# Altium footprint library Apalis Evaluation Board.PcbLib: 212 footprints (part 6 of 14)
Each footprint in its own frame and in the unit in brackets; x right, y up, seen from the top. Pads: shape width x height; smd on the part's side, far side on the other; paste and mask are expansions set on the pad; w line width, h text height; cw(c..) or ccw(c..) is an arc to the next point about the centre after c.
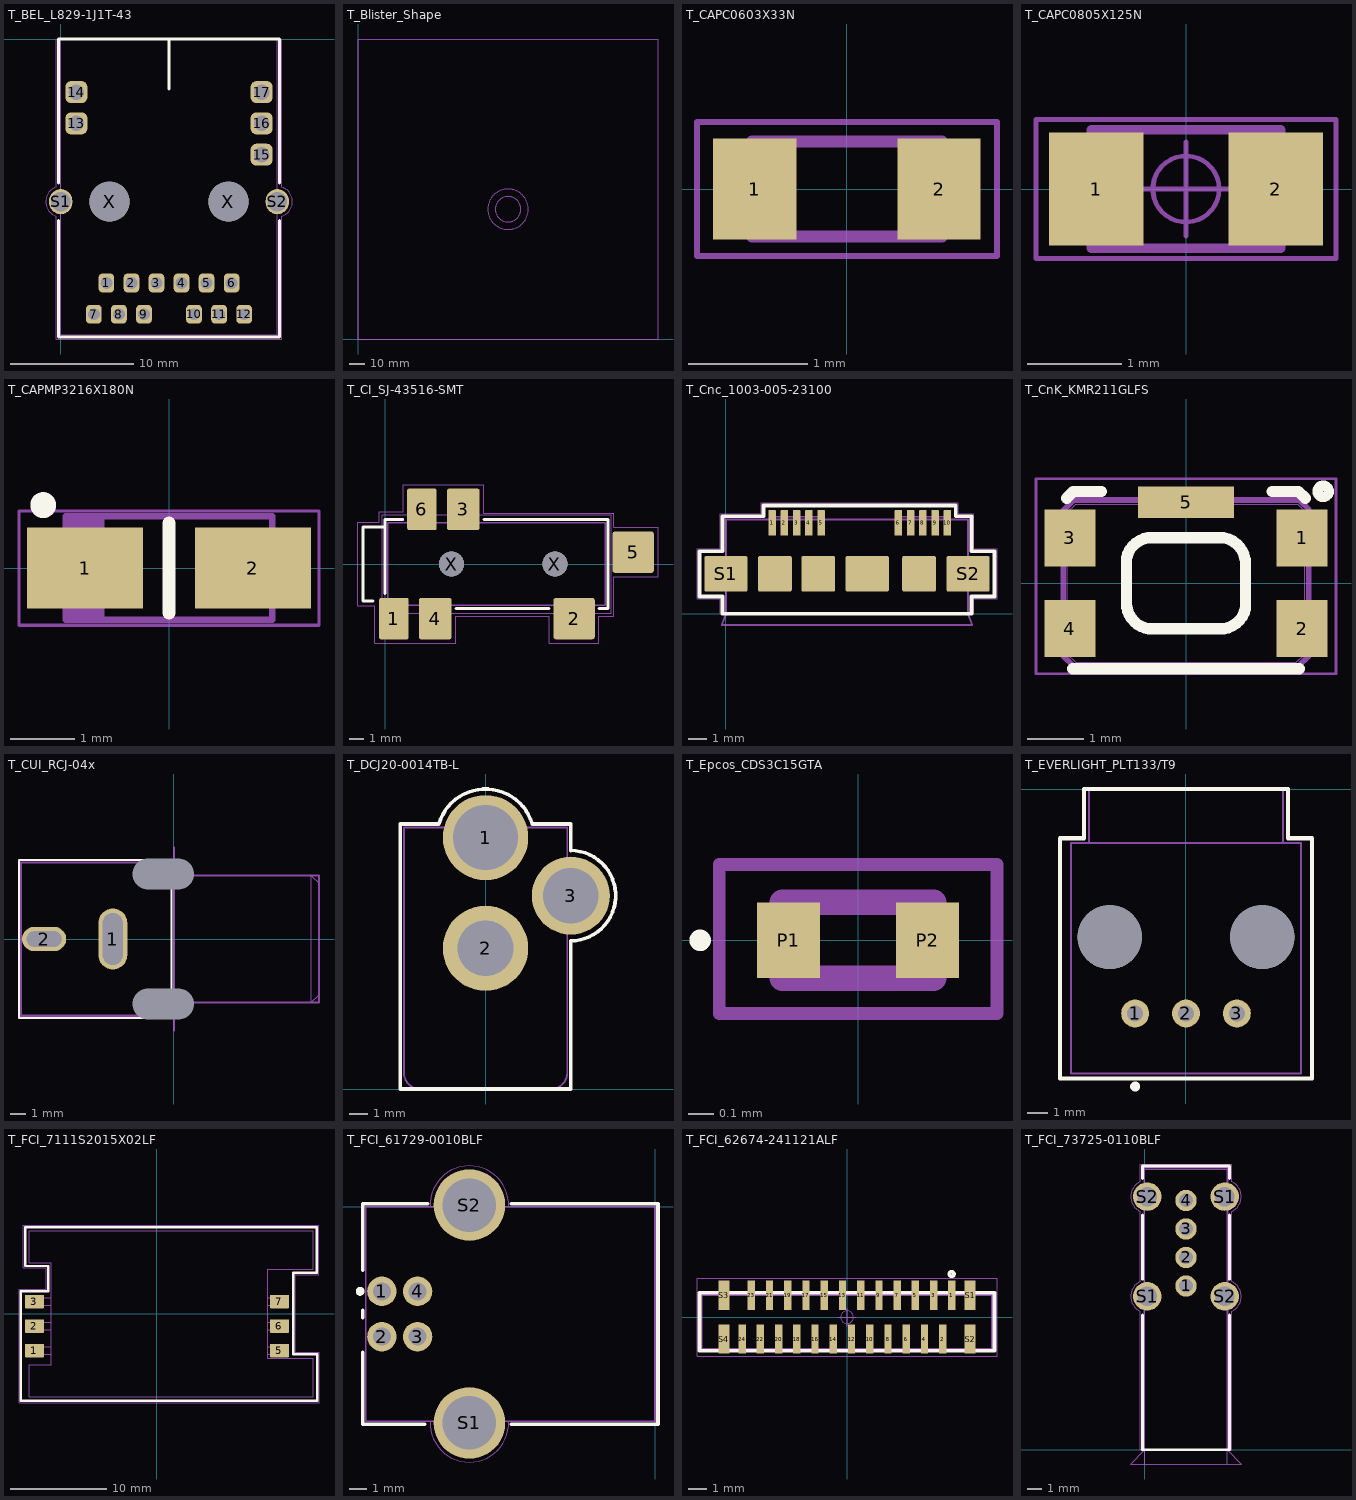
[diagram p5: the footprints below, top view; thin cyan lines are the x and y axes]

## T_BEL_L829-1J1T-43 [mil] "LOW PROFILE GIGABIT ETHERNET JACK WITH MAGS"
height 445
pads (21):
  rrect50% 50x60 hole 38: 1(146,-779.68) 2(226,-779.68) 3(306,-779.68) 4(386,-779.68) 5(466,-779.68) 6(546,-779.68) 7(106,-879.68) 8(186,-879.68) 9(266,-879.68) 10(426,-879.68) 11(506,-879.68) 12(586,-879.68)
  rrect50% 70x70 hole 50: 13(50,-269.69) 14(50,-169.69) 15(642,-369.69) 16(642,-269.69) 17(642,-169.69)
  oval 74x80 hole 62: S1(0,-519.68) S2(692,-519.68)
  round 128 hole 128 unplated: X(156,-519.68) X(536,-519.68)
Top Overlay:
  lines w10: -6.95,-579.68 -6.95,-951.77 699.02,-951.77 699.02,-579.68 ; -6.95,-459.49 -6.95,0 699.02,0 699.02,-460 ; 346,-159.69 346,-0.06 346.06,0
Mechanical 1:
  lines w1.97: -13.78,-473.23 -13.78,0 705.91,0 705.91,-473.24 ; -13.76,-473.28 ccw(c0.2,-519.71) -13.78,-566.13 -13.78,-958.66 705.91,-958.66 705.91,-566.09 ; 705.89,-566.05 ccw(c691.8,-519.66) 705.89,-473.28
Mechanical 2:
  lines w0.04: 0,-944.88 0,0 692.13,0 692.13,-944.88 0,-944.88
Mechanical 3:
  lines w3.94: 0,-944.88 0,0 692.13,0 692.13,-944.88 0,-944.88
3D body "l829-1j1t-43.step": height 494.05, standoff -150.89, extent -54.94,-946.68 746.36,19.67

## T_Blister_Shape [mm]
Mechanical 2:
  circle w0.254: c100,86.5 r8.5
  circle w0.254: c100,86.5 r13.5
Mechanical 15:
  lines w0.01: 0,0 200,0 200,200 0,200 0,0
3D body: height 24.9, standoff 22.4, extent 87.549,74.025 112.451,98.975
3D body: height 22.1, standoff 19.6, extent 88.047,74.524 111.953,98.476
3D body: height 19.3, standoff 16.8, extent 88.545,75.023 111.455,97.977
3D body: height 16.5, standoff 14, extent 89.043,75.522 110.957,97.478
3D body: height 13.7, standoff 11.2, extent 89.541,76.021 110.459,96.979
3D body: height 10.9, standoff 8.4, extent 90.039,76.52 109.961,96.48
3D body: height 27.7, standoff 25.2, extent 86.553,73.027 113.447,99.973
3D body: height 8.1, standoff 5.6, extent 90.537,77.019 109.463,95.981
3D body: height 5.3, standoff 2.8, extent 91.035,77.518 108.965,95.482
3D body: height 2.8, standoff 0, extent 91.534,78.017 108.466,94.983

## T_CAPC0603X33N [mm]
height 0.8
pads (2):
  rect 0.7x0.85 smd: 1(-0.775,0) 2(0.775,0)
Mechanical 1:
  lines w0.05: -1.261,-0.563 1.262,-0.563 1.262,0.563 -1.261,0.563 -1.261,-0.563
Mechanical 2:
  lines w0.001: -0.8,-0.4 0.8,-0.4 0.8,0.4 -0.8,0.4 -0.8,-0.4
Mechanical 3:
  lines w0.1: -0.8,-0.4 0.8,-0.4 0.8,0.4 -0.8,0.4 -0.8,-0.4
3D body: height 0.9, standoff 0, extent -0.8,-0.4 0.8,0.4

## T_CAPC0805X125N [mm]
height 1.25
pads (2):
  rect 1x1.2 smd: 1(-0.95,0) 2(0.95,0)
Mechanical 1:
  circle w0.05: c0,0 r0.35
  lines w0.05: -0.5,0 0.5,0 ; 0,-0.5 0,0.5 ; -1.586,-0.736 1.586,-0.736 1.586,0.736 -1.586,0.736 -1.586,-0.736
Mechanical 2:
  lines w0.001: -1,-0.625 -1,0.625 1,0.625 1,-0.625 -1,-0.625
Mechanical 3:
  lines w0.1: -1,-0.625 1,-0.625 1,0.625 -1,0.625 -1,-0.625
3D body: height 1.4, standoff 0, extent -1,-0.625 1,0.625

## T_CAPMP3216X180N [mm]
height 1.6
pads (2):
  rect 1.8x1.25 smd: 1(-1.3,0) 2(1.3,0)
Top Overlay:
  circle w0.3: c-1.95,0.975 r0.05
  lines w0.2: 0,-0.699 0,0.699
Mechanical 1:
  lines w0.05: -2.325,-0.886 2.325,-0.886 2.325,0.886 -2.325,0.886 -2.325,-0.886
Mechanical 2:
  lines w0.001: -1.6,-0.8 -1.6,0.8 1.6,0.8 1.6,-0.8 -1.6,-0.8
Mechanical 3:
  lines w0.1: -1.55,-0.8 -1.55,0.8 ; -1.45,-0.8 -1.45,0.8 ; -1.35,-0.8 -1.35,0.8 ; -1.25,-0.8 -1.25,0.8 ; -1.15,-0.8 -1.15,0.8 ; -1.05,-0.8 -1.05,0.8 ; -1.6,-0.8 -1.6,0.8 1.6,0.8 1.6,-0.8 -1.6,-0.8
3D body: height 1.6, standoff 0, extent -1.6,-0.8 -1,0.8
3D body: height 1.6, standoff 0, extent -1,-0.8 1.6,0.8

## T_CI_SJ-43516-SMT [mm] "STEREO_3.5mm AUDIO JACK  CUI"
height 5
pads (8):
  rrect12% 2x2.8 smd: 1(0.6,-3.7) 6(2.5,3.7)
  rrect12% 2.8x2.8 smd: 2(12.8,-3.7) 5(16.8,0.8)
  rrect12% 2.2x2.8 smd: 3(5.3,3.7) 4(3.4,-3.7)
  round 1.7 hole 1.7 unplated: X(4.5,0) X(11.5,0)
Top Overlay:
  lines w0.2: -0.8,-2.5 -1.5,-2.5 -1.5,2.5 0,2.5 ; 0,-2 0,3 1.2,3 ; 4.8,-3 11.1,-3 ; 6.7,3 15.1,3 15.1,-3 14.5,-3
Mechanical 1:
  lines w0.05: -1.83,-2.83 -0.68,-2.83 -0.68,-5.38 4.78,-5.38 4.78,-3.53 11.12,-3.53 11.12,-5.38 14.48,-5.38 14.48,-3.53 15.48,-3.53 15.48,-0.87 18.48,-0.87 18.48,2.48 15.48,2.48 15.48,3.45 6.68,3.45 6.68,5.38 1.22,5.38 1.22,3.53 -0.39,3.53 -0.39,2.83 -1.83,2.83 -1.83,-2.83
Mechanical 2:
  lines w0.001: -0.2,-3.35 15.3,-3.35 15.3,3.35 -0.2,3.35 -0.2,-3.35
Mechanical 3:
  lines w0.1: 0.2,-2.8 0.2,2.8 14.9,2.8 14.9,-2.8 0.2,-2.8

## T_Cnc_1003-005-23100 [mm] "USB Micro A/B 3.0"
height 2.92
pads (16):
  rrect12% 0.4x1.35 smd: 1(2.45,4.825) 2(3.1,4.825) 3(3.75,4.825) 4(4.4,4.825) 5(5.05,4.825) 6(9.15,4.825) 7(9.8,4.825) 8(10.45,4.825) 9(11.1,4.825) 10(11.75,4.825)
  rrect12% 2.3x1.9 smd: S1(0,2.125) S2(12.85,2.125) ""(7.5,2.125)
  rrect12% 1.8x1.9 smd: ""(2.6,2.125) ""(4.9,2.125) ""(10.25,2.125)
Top Overlay:
  lines w0.2: -1.4,0.925 -0.175,0.925 -0.175,0 13.025,0 13.025,0.925 14.25,0.925 14.25,3.325 13.025,3.325 13.025,5.175 12.2,5.175 12.2,5.755 2,5.755 2,5.175 -0.175,5.175 -0.175,3.325 -1.4,3.325 -1.4,0.925
Mechanical 1:
  lines w0.05: -1.535,0.79 -0.31,0.79 -0.31,0 13.16,0 13.16,0.79 14.385,0.79 14.385,3.46 13.16,3.46 13.16,5.31 12.335,5.31 12.335,5.89 1.865,5.89 1.865,5.31 -0.31,5.31 -0.31,3.46 -1.535,3.46 -1.535,0.79
Mechanical 2:
  lines w0.001: 0,1.675 -0.64,1.675 -0.64,2.575 0,2.575 ; 2.35,5 2.35,5.15 5.15,5.15 5.15,5 ; 9.05,5 9.05,5.15 11.85,5.15 11.85,5 ; 12.85,1.675 13.49,1.675 13.49,2.575 12.85,2.575 ; 0,0 12.85,0 ; 0,0 -0.22,-0.6 13.07,-0.6 12.85,0 ; 0,0 0,5 12.85,5 12.85,0
Mechanical 3:
  lines w0.1: 0,1.675 -0.64,1.675 -0.64,2.575 0,2.575 ; 2.35,5 2.35,5.15 5.15,5.15 5.15,5 ; 9.05,5 9.05,5.15 11.85,5.15 11.85,5 ; 12.85,1.675 13.49,1.675 13.49,2.575 12.85,2.575 ; 0,0 12.85,0 ; 0,0 0,5 12.85,5 12.85,0 ; 0,0 -0.22,-0.6 13.07,-0.6 12.85,0
3D body "USB3125.STEP": height 2.78, standoff -0.24, extent -0.65,-0.624 13.5,5.05

## T_CnK_KMR211GLFS [mm] "Microminiature Tact Switch for SMT"
height 1.9
pads (5):
  rect 0.9x1 smd: 1(2.05,0.8) 2(2.05,-0.8) 3(-2.05,0.8) 4(-2.05,-0.8)
  rect 1.7x0.55 smd: 5(0,1.43)
Top Overlay:
  circle w0.18: c2.424,1.624 r0.1
  lines w0.2: -2.109,1.502 -1.991,1.62 -1.5,1.62 ; -2,-1.51 2,-1.51 ; -1.05,-0.36 -1.05,0.44 ; -1.05,-0.35 ccw(c-0.59,-0.35) -0.662,-0.804 ; -1.05,0.444 cw(c-0.6,0.35) -0.669,0.805 ; -0.66,0.805 0.66,0.805 ; -0.655,-0.805 0.65,-0.805 ; 0.669,-0.805 ccw(c0.6,-0.35) 1.05,-0.444 ; 0.684,0.8 cw(c0.59,0.35) 1.045,0.419 ; 1.05,-0.44 1.05,0.4 ; 1.52,1.621 1.989,1.621 2.108,1.502
Mechanical 1:
  lines w0.05: -2.65,-1.6 -2.65,1.845 2.65,1.845 2.65,-1.6 -2.65,-1.6
Mechanical 2:
  lines w0.001: -2.1,-1.25 -2.1,1.25 -1.95,1.4 1.97,1.4 2.1,1.27 2.1,-1.25 1.95,-1.4 -1.95,-1.4 -2.1,-1.25
Mechanical 3:
  lines w0.1: -2.17,-1.28 -2.17,1.28 -1.98,1.47 2,1.47 2.17,1.3 2.17,-1.28 1.98,-1.47 -1.98,-1.47 -2.17,-1.28

## T_CUI_RCJ-04x [mm] "Right Angle RCA Connector THT"
height 12.6
pads (4):
  oval 1.9x4 hole 1.3 slot 3.4 at 90 deg: 1(-4,0)
  oval 2.9x1.6 hole 1 slot 2.3 at 0 deg: 2(-8.5,0)
  round 0 hole 2 slot 4 at 0 deg: Hole1(-0.7,4.25) Hole2(-0.7,-4.25)
Top Overlay:
  lines w0.127: -0.147,5.165 -10.143,5.165 -10.143,-5.165 -0.146,-5.165 -0.146,5.144
Mechanical 1:
  lines w0.127: -10.123,-5.152 -10.123,5.185 0,5.185 0,-5.152 -10.123,-5.152
Mechanical 2:
  lines w0: 0,-5 0,5
  lines w0.001: 0,-5 -10,-5 -10,5 0,5 ; 0,-4.15 9,-4.15 ; 0,4.15 9,4.15 ; 9,-4.15 9,4.15 ; 9,-4.15 9.5,-3.65 9.5,3.65 9,4.15
Mechanical 3:
  lines w0.127: 0,-6 0,6 ; 0,-4.15 9.5,-4.15 9.5,4.15 0,4.15 ; -10,-5 -10,5 0,5 0,-5 -10,-5

## T_DCJ20-0014TB-L [mm] "Header, 1x2 Pins, 2.54 mm pitch, male"
height 10.7
pads (3):
  round 4.7 hole 3.58: 1(0,13.85)
  round 4.7 hole 3.07: 2(0,7.75)
  round 4.3 hole 3.07: 3(4.7,10.65)
Top Overlay:
  lines w0.2: -2.569,14.598 cw(c0,13.85) 2.569,14.6 4.7,14.6 4.7,13.142 cw(c4.675,10.65) 4.7,8.158 ; -2.569,14.6 -4.7,14.6 -4.7,0 4.675,0 ; 4.7,0 4.7,8.157
Mechanical 1:
  lines w0.05: 4.675,0 -4.7,0 -4.7,14.6 -2.568,14.6 cw(c0,13.85) 2.568,14.6 4.7,14.6 4.7,13.125 cw(c4.7,10.65) 4.7,8.175 4.7,0
Mechanical 2:
  lines w0.001: -1.4,13.95 -1.4,14.4 -4.5,14.4 -4.5,0.9 ccw(c-3.6,0.9) -3.6,0 3.6,0 ; 1.4,13.95 1.4,14.4 4.5,14.4 4.5,0.9 cw(c3.6,0.9) 3.6,0
Mechanical 3:
  lines w0.1: -4.5,0.9 ccw(c-3.6,0.9) -3.6,0 3.6,0 ccw(c3.6,0.9) 4.5,0.9 4.5,14.4 -4.5,14.4 -4.5,0.9
3D body: height 7.4, standoff 5.4, extent -1,0 0.992,2
3D body: height 9.59, standoff 3.21, extent -3.2,0 3.175,2
3D body: height 4, standoff -3.7, extent -1.4,13.75 1.4,13.95
3D body: height 4, standoff -3.7, extent -1.2,7.65 1.2,7.85
3D body: height 4, standoff -3.7, extent 4.5,9.45 4.7,11.85
3D body: height 10.7, standoff 0, extent -4.5,0 4.5,14.4

## T_Epcos_CDS3C15GTA [mm] "Bidirectional ESD Protection"
height 0.27
pads (2):
  rect 0.25x0.3 smd: P1(-0.275,0) P2(0.275,0)
Top Overlay:
  circle w0.06: c-0.625,0 r0.012
Mechanical 1:
  lines w0.05: -0.55,-0.29 0.55,-0.29 0.55,0.3 -0.55,0.3 -0.55,-0.29
Mechanical 2:
  lines w0.001: -0.315,-0.165 0.315,-0.165 0.315,0.165 -0.315,0.165 -0.315,-0.165
Mechanical 3:
  lines w0.1: -0.3,-0.15 0.3,-0.15 0.3,0.15 -0.3,0.15 -0.3,-0.15
3D body: height 0.27, standoff 0, extent -0.315,-0.165 0.315,0.165

## T_EVERLIGHT_PLT133/T9 [mm] "USB Type B Connectors"
height 20
pads (5):
  round 1.4 hole 0.8: 1(-2.54,-11.21) 2(0,-11.21) 3(2.54,-11.21)
  round 3.2 hole 3.2 unplated: ""(-3.81,-7.4) ""(3.81,-7.4)
Top Overlay:
  circle w0.25: c-2.54,-14.86 r0.125
  lines w0.2: -6.3,-14.46 6.3,-14.46 6.3,-2.46 5.1,-2.46 5.1,0 -5.1,0 -5.1,-2.46 -6.3,-2.46 -6.3,-14.46
Mechanical 1:
  lines w0.05: -6.3,-14.46 -6.3,-2.46 -5.1,-2.46 -5.1,0 5.1,0 5.1,-2.46 6.3,-2.46 6.3,-14.46 -6.3,-14.46
Mechanical 2:
  lines w0.01: -4.85,-2.7 -4.85,0 4.85,0 4.85,-2.7 ; -5.75,-14.21 5.75,-14.21 5.75,-2.7 -5.75,-2.7 -5.75,-14.21
Mechanical 3:
  lines w0.1: -4.85,-2.7 -4.85,0 4.85,0 4.85,-2.7 ; -5.75,-14.21 5.75,-14.21 5.75,-2.7 -5.75,-2.7 -5.75,-14.21
3D body "User Library-PLT133_T9.step": height 19.12, standoff -4.15, extent -5.75,-13.715 5.75,0.085

## T_FCI_7111S2015X02LF [mm] "6 Contacts Sim Card Holder"
height 2.5
pads (6):
  rrect12% 2x1.4 smd: 1(-12.7,-3.81) 2(-12.7,-1.27) 3(-12.7,1.27) 5(12.7,-3.81) 6(12.7,-1.27) 7(12.7,1.27)
Top Overlay:
  lines w0.254: -14.1,-9 -14.1,2.35 -11.25,2.35 -11.25,4.95 -13.65,4.95 -13.65,8.95 16.55,8.95 16.55,4.25 14.15,4.25 14.15,-4.2 16.6,-4.2 16.6,-9 -14.1,-9
Mechanical 1:
  lines w0.05: -14.3,-9.2 16.8,-9.2 16.8,-4 14.35,-4 14.35,4.05 16.75,4.05 16.75,9.15 -13.85,9.15 -13.85,4.75 -11.45,4.75 -11.45,2.55 -14.3,2.55 -14.3,-9.2
Mechanical 2:
  lines w0.01: -10.95,-4.21 -13.25,-4.21 -13.25,-3.41 -10.95,-3.41 ; -10.95,-1.67 -13.25,-1.67 -13.25,-0.87 -10.95,-0.87 ; -10.95,0.87 -13.25,0.87 -13.25,1.67 -10.95,1.67 ; 11.49,-4.21 13.25,-4.21 13.25,-3.41 11.49,-3.41 ; 11.49,-1.67 13.25,-1.67 13.25,-0.87 11.49,-0.87 ; 11.49,0.87 13.25,0.87 13.25,1.67 11.49,1.67 ; -13.25,-8.6 -13.25,-5.3 -10.95,-5.3 -10.95,5.3 -13.25,5.3 -13.25,8.6 16.19,8.6 16.19,4.6 11.49,4.6 11.49,-4.6 16.19,-4.6 16.19,-8.6 -13.25,-8.6
Mechanical 3:
  lines w0.1: -13.25,-8.6 16.19,-8.6 16.19,-4.6 11.49,-4.6 11.49,4.6 16.19,4.6 16.19,8.6 -13.25,8.6 -13.25,5.3 -10.95,5.3 -10.95,-5.3 -13.25,-5.3 -13.25,-8.6
3D body "SW3dPS-SIMLOCK-1.STEP": height 2.5, standoff 0, extent -13.552,-8.726 16.448,8.574

## T_FCI_61729-0010BLF [mm] "USB Type B Connectors"
height 10.6
pads (6):
  round 1.65 hole 1: 1(-15.3,-4.73) 2(-15.3,-7.27) 3(-13.3,-7.27) 4(-13.3,-4.73)
  round 4 hole 3: S1(-10.4,-12.1) S2(-10.4,0.1)
Top Overlay:
  circle w0.25: c-16.512,-4.73 r0.125
  lines w0.2: -16.362,-8.14 -16.362,-12.163 -12.89,-12.163 ; -16.362,-6.21 -16.362,-5.8 ; -16.362,-3.55 -16.362,0.162 -12.737,0.162 ; -8.062,-12.163 0.163,-12.163 0.163,0.162 -8.062,0.162
Mechanical 1:
  lines w0.05: -16.2,-12 -12.598,-12 ccw(c-10.4,-12.096) -8.202,-12 0,-12 0,-0.003 -0.003,0 -8.202,0 ccw(c-10.4,0.096) -12.598,0 -16.2,0 -16.2,-12
Mechanical 2:
  lines w0.001: -16.2,-12 0,-12 0,0 -16.2,0 -16.2,-12
Mechanical 3:
  lines w0.1: -16.2,-12 0,-12 0,0 -16.2,0 -16.2,-12
3D body "Samtec-USBR-B-F-S-O-TH.STEP": height 11.02, standoff -3.7, extent -16.61,-13.43 -0.31,1.469

## T_FCI_62674-241121ALF [mm] "DVI FFC Connector 0.5mm pitch"
height 4.1
pads (28):
  rect 0.4x1.6 smd: 1(5.75,1.2) 2(5.25,-1.2) 3(4.75,1.2) 4(4.25,-1.2) 5(3.75,1.2) 6(3.25,-1.2) 7(2.75,1.2) 8(2.25,-1.2) 9(1.75,1.2) 10(1.25,-1.2) 11(0.75,1.2) 12(0.25,-1.2) 13(-0.25,1.2) 14(-0.75,-1.2) 15(-1.25,1.2) 16(-1.75,-1.2) 17(-2.25,1.2) 18(-2.75,-1.2) 19(-3.25,1.2) 20(-3.75,-1.2) 21(-4.25,1.2) 22(-4.75,-1.2) 23(-5.25,1.2) 24(-5.75,-1.2)
  rect 0.6x1.6 smd: S1(6.75,1.2) S2(6.75,-1.199) S3(-6.75,1.2) S4(-6.75,-1.2)
Top Overlay:
  circle w0.2: c5.742,2.367 r0.125
  lines w0.2: -8.089,-1.836 8.086,-1.836 8.086,1.342 -8.086,1.342 -8.086,-1.831
Mechanical 1:
  circle w0.05: c0,0 r0.35
  lines w0.05: -0.5,0 0.5,0 ; 0,-0.5 0,0.5 ; -8.226,-2.141 8.226,-2.141 8.226,2.141 -8.226,2.141 -8.226,-2.141
Mechanical 2:
  lines w0.001: -7.95,-1.7 7.95,-1.7 7.95,1.2 -7.95,1.2 -7.95,-1.7
Mechanical 3:
  lines w0.1: -8.011,-1.761 8.011,-1.761 8.011,1.276 -8.011,1.276 -8.011,-1.761

## T_FCI_73725-0110BLF [mm] "USB Type A Connector Vertical"
height 13.83
pads (8):
  round 1.5 hole 0.95: 1(2.88,11.49) 2(2.88,13.49) 3(2.88,15.49) 4(2.88,17.49)
  round 2 hole 1.37: S1(0.16,10.76) S1(5.6,17.76) S2(0.16,17.76) S2(5.6,10.76)
Top Overlay:
  lines w0.2: -0.166,9.463 -0.166,0 5.926,0 5.926,9.463 ; -0.166,11.964 -0.166,16.474 ; -0.166,19.025 -0.166,19.898 5.926,19.898 5.926,19.025 ; 5.922,11.964 5.922,16.474
Mechanical 1:
  lines w0.05: -0.322,9.709 -0.322,0 6.081,0 6.081,9.707 ; -0.322,18.812 -0.322,20.046 -0.32,20.048 6.081,20.048 ; -0.321,9.708 cw(c0.16,10.76) -0.322,11.812 ; -0.321,11.813 -0.321,16.708 cw(c0.16,17.76) -0.322,18.812 ; 6.081,16.707 6.081,11.812 cw(c5.6,10.76) 6.082,9.708 ; 6.081,18.812 cw(c5.6,17.76) 6.082,16.708 ; 6.082,18.814 6.082,20.048
Mechanical 2:
  lines w0.001: 0,-1 0,19.678 5.76,19.678 5.76,-1 ; -1,-1 0,0 5.76,0 6.76,-1 -1,-1
Mechanical 3:
  lines w0.1: -0.068,19.778 5.826,19.778 5.826,0 -0.065,0 -0.065,19.778